# Altium footprint library Molex FFC - FPC Connectors (SMT).PcbLib: 638 footprints (part 16 of 40)
Each footprint in its own frame and in the unit in brackets; x right, y up, seen from the top. Pads: shape width x height; smd on the part's side, far side on the other; paste and mask are expansions set on the pad; w line width, h text height; cw(c..) or ccw(c..) is an arc to the next point about the centre after c.
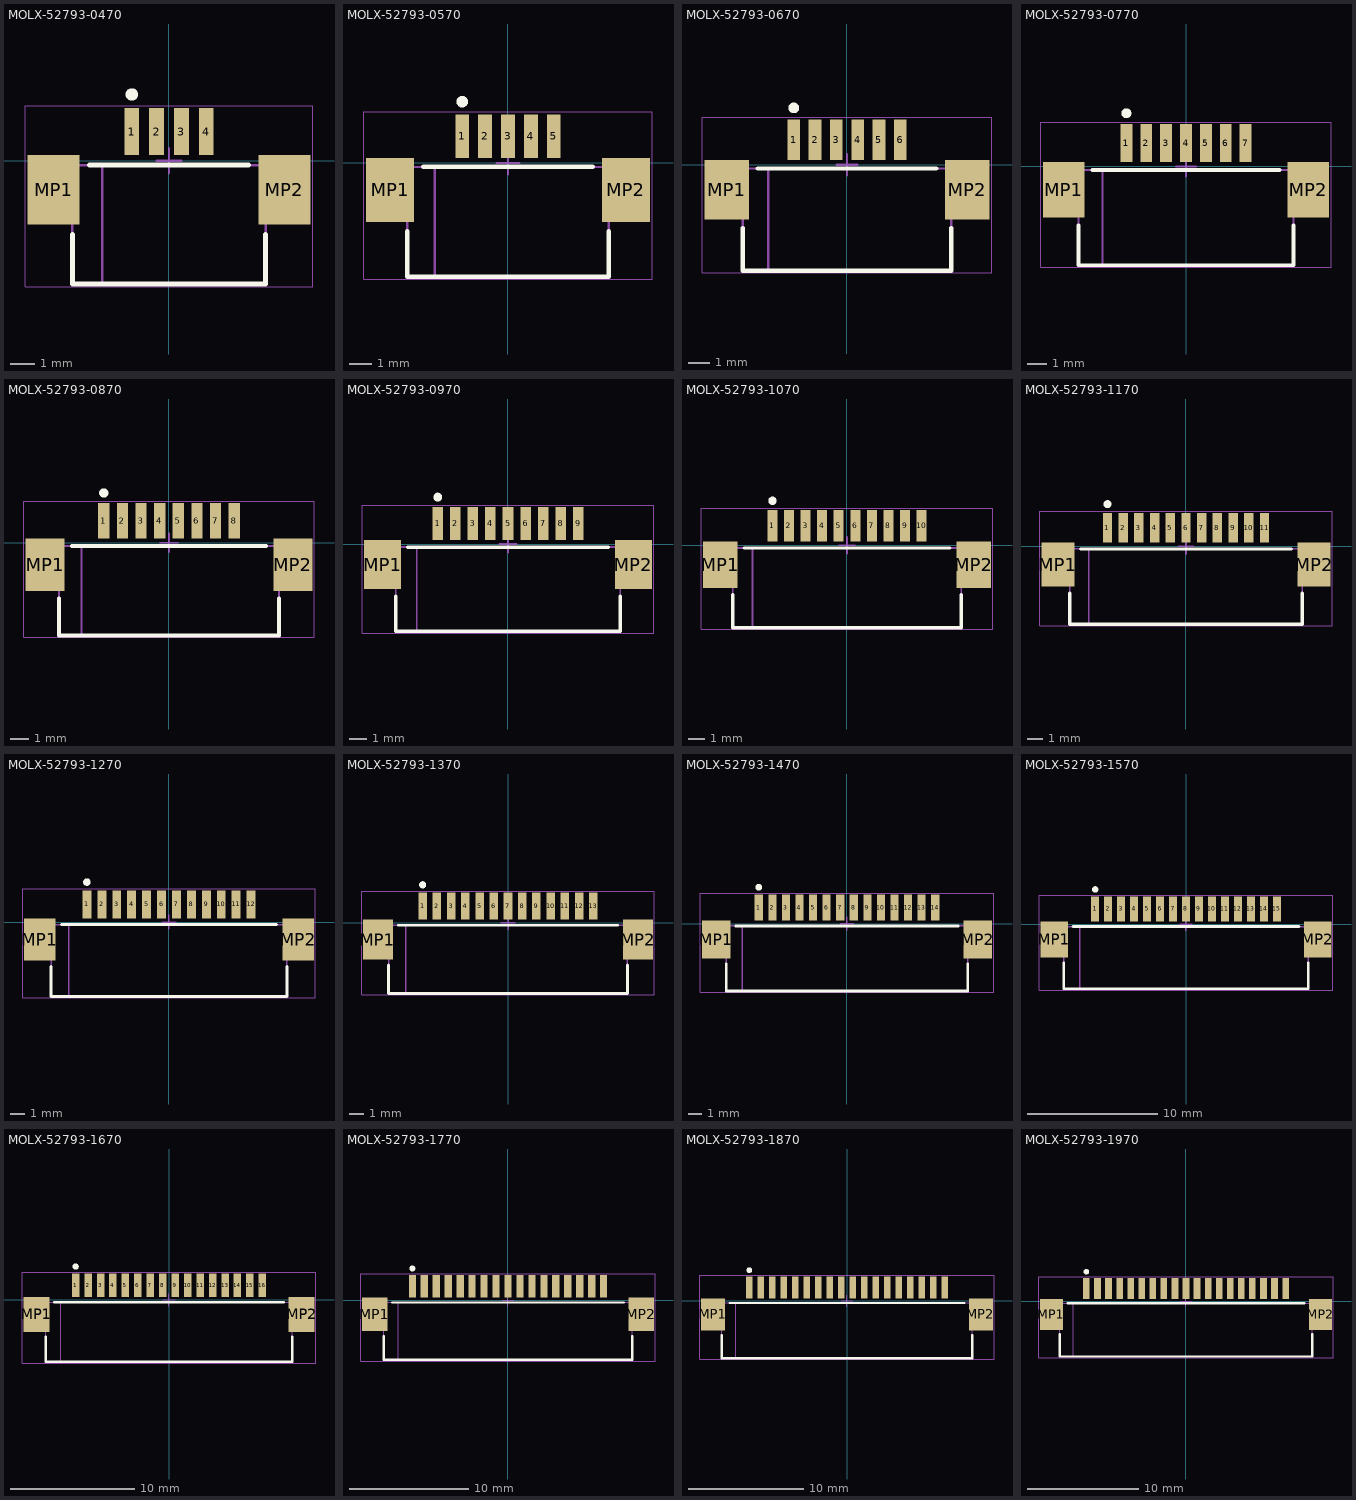
[diagram p15: the footprints below, top view; thin cyan lines are the x and y axes]

## MOLX-52793-0470 [mm] "FFC Connector, 4-Leads, Right Angle, Pitch 1.0 mm, Mated Height 3.1 mm, SMT"
height 3.1
pads (6):
  rect 0.6x1.9 smd: 1(-1.5,1.175) 2(-0.5,1.175) 3(0.5,1.175) 4(1.5,1.175)
  rect 2.1x2.8 smd: MP1(-4.65,-1.175) MP2(4.65,-1.175)
Top Overlay:
  circle w0.25: c-1.5,2.675 r0.125
  lines w0.2: -3.9,-2.975 -3.9,-4.975 3.9,-4.975 3.9,-2.975 ; -3.2,-0.175 3.2,-0.175
Mechanical 13:
  lines w0.1: -2.7,-4.975 -2.7,-0.175 ; -3.9,-4.975 3.9,-4.975 3.9,-0.175 -3.9,-0.175 -3.9,-4.975
Mechanical 15:
  lines w0.05: -5.8,-5.075 -5.8,2.225 5.8,2.225 5.8,-5.075 -5.8,-5.075
  lines w0.1: -0.5,0 0.5,0 ; 0,-0.5 0,0.5
3D body: height 0.25, standoff 0, extent -5.15,-4.975 5.15,1.825

## MOLX-52793-0570 [mm] "FFC Connector, 5-Leads, Right Angle, Pitch 1.0 mm, Mated Height 3.1 mm, SMT"
height 3.1
pads (7):
  rect 0.6x1.9 smd: 1(-2,1.175) 2(-1,1.175) 3(0,1.175) 4(1,1.175) 5(2,1.175)
  rect 2.1x2.8 smd: MP1(-5.15,-1.175) MP2(5.15,-1.175)
Top Overlay:
  circle w0.25: c-2,2.675 r0.125
  lines w0.2: -4.4,-2.975 -4.4,-4.975 4.4,-4.975 4.4,-2.975 ; -3.7,-0.175 3.7,-0.175
Mechanical 13:
  lines w0.1: -3.2,-4.975 -3.2,-0.175 ; -4.4,-4.975 -4.4,-0.175 4.4,-0.175 4.4,-4.975 -4.4,-4.975
Mechanical 15:
  lines w0.05: -6.3,-5.075 6.3,-5.075 6.3,2.225 -6.3,2.225 -6.3,-5.075
  lines w0.1: -0.5,0 0.5,0 ; 0,-0.5 0,0.5
3D body: height 0.25, standoff 0, extent -5.65,-4.975 5.65,1.825

## MOLX-52793-0670 [mm] "FFC Connector, 6-Leads, Right Angle, Pitch 1.0 mm, Mated Height 3.1 mm, SMT"
height 3.1
pads (8):
  rect 0.6x1.9 smd: 1(-2.5,1.175) 2(-1.5,1.175) 3(-0.5,1.175) 4(0.5,1.175) 5(1.5,1.175) 6(2.5,1.175)
  rect 2.1x2.8 smd: MP1(-5.65,-1.175) MP2(5.65,-1.175)
Top Overlay:
  circle w0.25: c-2.5,2.675 r0.125
  lines w0.2: -4.9,-2.975 -4.9,-4.975 4.9,-4.975 4.9,-2.975 ; -4.2,-0.175 4.2,-0.175
Mechanical 13:
  lines w0.1: -3.7,-4.975 -3.7,-0.175 ; -4.9,-4.975 4.9,-4.975 4.9,-0.175 -4.9,-0.175 -4.9,-4.975
Mechanical 15:
  lines w0.05: -6.8,-5.075 -6.8,2.225 6.8,2.225 6.8,-5.075 -6.8,-5.075
  lines w0.1: -0.5,0 0.5,0 ; 0,-0.5 0,0.5
3D body: height 0.25, standoff 0, extent -6.15,-4.975 6.15,1.825

## MOLX-52793-0770 [mm] "FFC Connector, 7-Leads, Right Angle, Pitch 1.0 mm, Mated Height 3.1 mm, SMT"
height 3.1
pads (9):
  rect 0.6x1.9 smd: 1(-3,1.175) 2(-2,1.175) 3(-1,1.175) 4(0,1.175) 5(1,1.175) 6(2,1.175) 7(3,1.175)
  rect 2.1x2.8 smd: MP1(-6.15,-1.175) MP2(6.15,-1.175)
Top Overlay:
  circle w0.25: c-3,2.675 r0.125
  lines w0.2: -5.4,-2.975 -5.4,-4.975 5.4,-4.975 5.4,-2.975 ; -4.7,-0.175 4.7,-0.175
Mechanical 13:
  lines w0.1: -4.2,-4.975 -4.2,-0.175 ; -5.4,-4.975 5.4,-4.975 5.4,-0.175 -5.4,-0.175 -5.4,-4.975
Mechanical 15:
  lines w0.05: -7.3,-5.075 7.3,-5.075 7.3,2.225 -7.3,2.225 -7.3,-5.075
  lines w0.1: -0.5,0 0.5,0 ; 0,-0.5 0,0.5
3D body: height 0.25, standoff 0, extent -6.65,-4.975 6.65,1.825

## MOLX-52793-0870 [mm] "FFC Connector, 8-Leads, Right Angle, Pitch 1.0 mm, Mated Height 3.1 mm, SMT"
height 3.1
pads (10):
  rect 0.6x1.9 smd: 1(-3.5,1.175) 2(-2.5,1.175) 3(-1.5,1.175) 4(-0.5,1.175) 5(0.5,1.175) 6(1.5,1.175) 7(2.5,1.175) 8(3.5,1.175)
  rect 2.1x2.8 smd: MP1(-6.65,-1.175) MP2(6.65,-1.175)
Top Overlay:
  circle w0.25: c-3.5,2.675 r0.125
  lines w0.2: -5.9,-2.975 -5.9,-4.975 5.9,-4.975 5.9,-2.975 ; -5.2,-0.175 5.2,-0.175
Mechanical 13:
  lines w0.1: -4.7,-4.975 -4.7,-0.175 ; -5.9,-4.975 -5.9,-0.175 5.9,-0.175 5.9,-4.975 -5.9,-4.975
Mechanical 15:
  lines w0.05: -7.8,-5.075 -7.8,2.225 7.8,2.225 7.8,-5.075 -7.8,-5.075
  lines w0.1: -0.5,0 0.5,0 ; 0,-0.5 0,0.5
3D body: height 0.25, standoff 0, extent -7.15,-4.975 7.15,1.825

## MOLX-52793-0970 [mm] "FFC Connector, 9-Leads, Right Angle, Pitch 1.0 mm, Mated Height 3.1 mm, SMT"
height 3.1
pads (11):
  rect 0.6x1.9 smd: 1(-4,1.175) 2(-3,1.175) 3(-2,1.175) 4(-1,1.175) 5(0,1.175) 6(1,1.175) 7(2,1.175) 8(3,1.175) 9(4,1.175)
  rect 2.1x2.8 smd: MP1(-7.15,-1.175) MP2(7.15,-1.175)
Top Overlay:
  circle w0.25: c-4,2.675 r0.125
  lines w0.2: -6.4,-2.975 -6.4,-4.975 6.4,-4.975 6.4,-2.975 ; -5.7,-0.175 5.7,-0.175
Mechanical 13:
  lines w0.1: -5.2,-4.975 -5.2,-0.175 ; -6.4,-4.975 6.4,-4.975 6.4,-0.175 -6.4,-0.175 -6.4,-4.975
Mechanical 15:
  lines w0.05: -8.3,-5.075 8.3,-5.075 8.3,2.225 -8.3,2.225 -8.3,-5.075
  lines w0.1: -0.5,0 0.5,0 ; 0,-0.5 0,0.5
3D body: height 0.25, standoff 0, extent -7.65,-4.975 7.65,1.825

## MOLX-52793-1070 [mm] "FFC Connector, 10-Leads, Right Angle, Pitch 1.0 mm, Mated Height 3.1 mm, SMT"
height 3.1
pads (12):
  rect 0.6x1.9 smd: 1(-4.5,1.175) 2(-3.5,1.175) 3(-2.5,1.175) 4(-1.5,1.175) 5(-0.5,1.175) 6(0.5,1.175) 7(1.5,1.175) 8(2.5,1.175) 9(3.5,1.175) 10(4.5,1.175)
  rect 2.1x2.8 smd: MP1(-7.65,-1.175) MP2(7.65,-1.175)
Top Overlay:
  circle w0.25: c-4.5,2.675 r0.125
  lines w0.2: -6.9,-2.975 -6.9,-4.975 6.9,-4.975 6.9,-2.975 ; -6.2,-0.175 6.2,-0.175
Mechanical 13:
  lines w0.1: -5.7,-4.975 -5.7,-0.175 ; -6.9,-4.975 -6.9,-0.175 6.9,-0.175 6.9,-4.975 -6.9,-4.975
Mechanical 15:
  lines w0.05: -8.8,-5.075 -8.8,2.225 8.8,2.225 8.8,-5.075 -8.8,-5.075
  lines w0.1: -0.5,0 0.5,0 ; 0,-0.5 0,0.5
3D body: height 0.25, standoff 0, extent -8.15,-4.975 8.15,1.825

## MOLX-52793-1170 [mm] "FFC Connector, 11-Leads, Right Angle, Pitch 1.0 mm, Mated Height 3.1 mm, SMT"
height 3.1
pads (13):
  rect 0.6x1.9 smd: 1(-5,1.175) 2(-4,1.175) 3(-3,1.175) 4(-2,1.175) 5(-1,1.175) 6(0,1.175) 7(1,1.175) 8(2,1.175) 9(3,1.175) 10(4,1.175) 11(5,1.175)
  rect 2.1x2.8 smd: MP1(-8.15,-1.175) MP2(8.15,-1.175)
Top Overlay:
  circle w0.25: c-5,2.675 r0.125
  lines w0.2: -7.4,-2.975 -7.4,-4.975 7.4,-4.975 7.4,-2.975 ; -6.7,-0.175 6.7,-0.175
Mechanical 13:
  lines w0.1: -6.2,-4.975 -6.2,-0.175 ; -7.4,-4.975 -7.4,-0.175 7.4,-0.175 7.4,-4.975 -7.4,-4.975
Mechanical 15:
  lines w0.05: -9.3,-5.075 -9.3,2.225 9.3,2.225 9.3,-5.075 -9.3,-5.075
  lines w0.1: -0.5,0 0.5,0 ; 0,-0.5 0,0.5
3D body: height 0.25, standoff 0, extent -8.65,-4.975 8.65,1.825

## MOLX-52793-1270 [mm] "FFC Connector, 12-Leads, Right Angle, Pitch 1.0 mm, Mated Height 3.1 mm, SMT"
height 3.1
pads (14):
  rect 0.6x1.9 smd: 1(-5.5,1.175) 2(-4.5,1.175) 3(-3.5,1.175) 4(-2.5,1.175) 5(-1.5,1.175) 6(-0.5,1.175) 7(0.5,1.175) 8(1.5,1.175) 9(2.5,1.175) 10(3.5,1.175) 11(4.5,1.175) 12(5.5,1.175)
  rect 2.1x2.8 smd: MP1(-8.65,-1.175) MP2(8.65,-1.175)
Top Overlay:
  circle w0.25: c-5.5,2.675 r0.125
  lines w0.2: -7.9,-2.975 -7.9,-4.975 7.9,-4.975 7.9,-2.975 ; -7.2,-0.175 7.2,-0.175
Mechanical 13:
  lines w0.1: -6.7,-4.975 -6.7,-0.175 ; -7.9,-4.975 -7.9,-0.175 7.9,-0.175 7.9,-4.975 -7.9,-4.975
Mechanical 15:
  lines w0.05: -9.8,-5.075 -9.8,2.225 9.8,2.225 9.8,-5.075 -9.8,-5.075
  lines w0.1: -0.5,0 0.5,0 ; 0,-0.5 0,0.5
3D body: height 0.25, standoff 0, extent -9.15,-4.975 9.15,1.825

## MOLX-52793-1370 [mm] "FFC Connector, 13-Leads, Right Angle, Pitch 1.0 mm, Mated Height 3.1 mm, SMT"
height 3.1
pads (15):
  rect 0.6x1.9 smd: 1(-6,1.175) 2(-5,1.175) 3(-4,1.175) 4(-3,1.175) 5(-2,1.175) 6(-1,1.175) 7(0,1.175) 8(1,1.175) 9(2,1.175) 10(3,1.175) 11(4,1.175) 12(5,1.175) 13(6,1.175)
  rect 2.1x2.8 smd: MP1(-9.15,-1.175) MP2(9.15,-1.175)
Top Overlay:
  circle w0.25: c-6,2.675 r0.125
  lines w0.2: -8.4,-2.975 -8.4,-4.975 8.4,-4.975 8.4,-2.975 ; -7.7,-0.175 7.7,-0.175
Mechanical 13:
  lines w0.1: -7.2,-4.975 -7.2,-0.175 ; -8.4,-4.975 8.4,-4.975 8.4,-0.175 -8.4,-0.175 -8.4,-4.975
Mechanical 15:
  lines w0.05: -10.3,-5.075 10.3,-5.075 10.3,2.225 -10.3,2.225 -10.3,-5.075
  lines w0.1: -0.5,0 0.5,0 ; 0,-0.5 0,0.5
3D body: height 0.25, standoff 0, extent -9.65,-4.975 9.65,1.825

## MOLX-52793-1470 [mm] "FFC Connector, 14-Leads, Right Angle, Pitch 1.0 mm, Mated Height 3.1 mm, SMT"
height 3.1
pads (16):
  rect 0.6x1.9 smd: 1(-6.5,1.175) 2(-5.5,1.175) 3(-4.5,1.175) 4(-3.5,1.175) 5(-2.5,1.175) 6(-1.5,1.175) 7(-0.5,1.175) 8(0.5,1.175) 9(1.5,1.175) 10(2.5,1.175) 11(3.5,1.175) 12(4.5,1.175) 13(5.5,1.175) 14(6.5,1.175)
  rect 2.1x2.8 smd: MP1(-9.65,-1.175) MP2(9.65,-1.175)
Top Overlay:
  circle w0.25: c-6.5,2.675 r0.125
  lines w0.2: -8.9,-2.975 -8.9,-4.975 8.9,-4.975 8.9,-2.975 ; -8.2,-0.175 8.2,-0.175
Mechanical 13:
  lines w0.1: -7.7,-4.975 -7.7,-0.175 ; -8.9,-4.975 -8.9,-0.175 8.9,-0.175 8.9,-4.975 -8.9,-4.975
Mechanical 15:
  lines w0.05: -10.8,-5.075 -10.8,2.225 10.8,2.225 10.8,-5.075 -10.8,-5.075
  lines w0.1: -0.5,0 0.5,0 ; 0,-0.5 0,0.5
3D body: height 0.25, standoff 0, extent -10.15,-4.975 10.15,1.825

## MOLX-52793-1570 [mm] "FFC Connector, 15-Leads, Right Angle, Pitch 1.0 mm, Mated Height 3.1 mm, SMT"
height 3.1
pads (17):
  rect 0.6x1.9 smd: 1(-7,1.175) 2(-6,1.175) 3(-5,1.175) 4(-4,1.175) 5(-3,1.175) 6(-2,1.175) 7(-1,1.175) 8(0,1.175) 9(1,1.175) 10(2,1.175) 11(3,1.175) 12(4,1.175) 13(5,1.175) 14(6,1.175) 15(7,1.175)
  rect 2.1x2.8 smd: MP1(-10.15,-1.175) MP2(10.15,-1.175)
Top Overlay:
  circle w0.25: c-7,2.675 r0.125
  lines w0.2: -9.4,-2.975 -9.4,-4.975 9.4,-4.975 9.4,-2.975 ; -8.7,-0.175 8.7,-0.175
Mechanical 13:
  lines w0.1: -8.2,-4.975 -8.2,-0.175 ; -9.4,-4.975 9.4,-4.975 9.4,-0.175 -9.4,-0.175 -9.4,-4.975
Mechanical 15:
  lines w0.05: -11.3,-5.075 11.3,-5.075 11.3,2.225 -11.3,2.225 -11.3,-5.075
  lines w0.1: -0.5,0 0.5,0 ; 0,-0.5 0,0.5
3D body: height 0.25, standoff 0, extent -10.65,-4.975 10.65,1.825

## MOLX-52793-1670 [mm] "FFC Connector, 16-Leads, Right Angle, Pitch 1.0 mm, Mated Height 3.1 mm, SMT"
height 3.1
pads (18):
  rect 0.6x1.9 smd: 1(-7.5,1.175) 2(-6.5,1.175) 3(-5.5,1.175) 4(-4.5,1.175) 5(-3.5,1.175) 6(-2.5,1.175) 7(-1.5,1.175) 8(-0.5,1.175) 9(0.5,1.175) 10(1.5,1.175) 11(2.5,1.175) 12(3.5,1.175) 13(4.5,1.175) 14(5.5,1.175) 15(6.5,1.175) 16(7.5,1.175)
  rect 2.1x2.8 smd: MP1(-10.65,-1.175) MP2(10.65,-1.175)
Top Overlay:
  circle w0.25: c-7.5,2.675 r0.125
  lines w0.2: -9.9,-2.975 -9.9,-4.975 9.9,-4.975 9.9,-2.975 ; -9.2,-0.175 9.2,-0.175
Mechanical 13:
  lines w0.1: -8.7,-4.975 -8.7,-0.175 ; -9.9,-4.975 9.9,-4.975 9.9,-0.175 -9.9,-0.175 -9.9,-4.975
Mechanical 15:
  lines w0.05: -11.8,-5.075 11.8,-5.075 11.8,2.225 -11.8,2.225 -11.8,-5.075
  lines w0.1: -0.5,0 0.5,0 ; 0,-0.5 0,0.5
3D body: height 0.25, standoff 0, extent -11.15,-4.975 11.15,1.825

## MOLX-52793-1770 [mm] "FFC Connector, 17-Leads, Right Angle, Pitch 1.0 mm, Mated Height 3.1 mm, SMT"
height 3.1
pads (19):
  rect 0.6x1.9 smd: 1(-8,1.175) 2(-7,1.175) 3(-6,1.175) 4(-5,1.175) 5(-4,1.175) 6(-3,1.175) 7(-2,1.175) 8(-1,1.175) 9(0,1.175) 10(1,1.175) 11(2,1.175) 12(3,1.175) 13(4,1.175) 14(5,1.175) 15(6,1.175) 16(7,1.175) 17(8,1.175)
  rect 2.1x2.8 smd: MP1(-11.15,-1.175) MP2(11.15,-1.175)
Top Overlay:
  circle w0.25: c-8,2.675 r0.125
  lines w0.2: -10.4,-2.975 -10.4,-4.975 10.4,-4.975 10.4,-2.975 ; -9.7,-0.175 9.7,-0.175
Mechanical 13:
  lines w0.1: -9.2,-4.975 -9.2,-0.175 ; -10.4,-4.975 10.4,-4.975 10.4,-0.175 -10.4,-0.175 -10.4,-4.975
Mechanical 15:
  lines w0.05: -12.3,-5.075 12.3,-5.075 12.3,2.225 -12.3,2.225 -12.3,-5.075
  lines w0.1: -0.5,0 0.5,0 ; 0,-0.5 0,0.5
3D body: height 0.25, standoff 0, extent -11.65,-4.975 11.65,1.825

## MOLX-52793-1870 [mm] "FFC Connector, 18-Leads, Right Angle, Pitch 1.0 mm, Mated Height 3.1 mm, SMT"
height 3.1
pads (20):
  rect 0.6x1.9 smd: 1(-8.5,1.175) 2(-7.5,1.175) 3(-6.5,1.175) 4(-5.5,1.175) 5(-4.5,1.175) 6(-3.5,1.175) 7(-2.5,1.175) 8(-1.5,1.175) 9(-0.5,1.175) 10(0.5,1.175) 11(1.5,1.175) 12(2.5,1.175) 13(3.5,1.175) 14(4.5,1.175) 15(5.5,1.175) 16(6.5,1.175) 17(7.5,1.175) 18(8.5,1.175)
  rect 2.1x2.8 smd: MP1(-11.65,-1.175) MP2(11.65,-1.175)
Top Overlay:
  circle w0.25: c-8.5,2.675 r0.125
  lines w0.2: -10.9,-2.975 -10.9,-4.975 10.9,-4.975 10.9,-2.975 ; -10.2,-0.175 10.2,-0.175
Mechanical 13:
  lines w0.1: -9.7,-4.975 -9.7,-0.175 ; -10.9,-4.975 -10.9,-0.175 10.9,-0.175 10.9,-4.975 -10.9,-4.975
Mechanical 15:
  lines w0.05: -12.8,-5.075 -12.8,2.225 12.8,2.225 12.8,-5.075 -12.8,-5.075
  lines w0.1: -0.5,0 0.5,0 ; 0,-0.5 0,0.5
3D body: height 0.25, standoff 0, extent -12.15,-4.975 12.15,1.825

## MOLX-52793-1970 [mm] "FFC Connector, 19-Leads, Right Angle, Pitch 1.0 mm, Mated Height 3.1 mm, SMT"
height 3.1
pads (21):
  rect 0.6x1.9 smd: 1(-9,1.175) 2(-8,1.175) 3(-7,1.175) 4(-6,1.175) 5(-5,1.175) 6(-4,1.175) 7(-3,1.175) 8(-2,1.175) 9(-1,1.175) 10(0,1.175) 11(1,1.175) 12(2,1.175) 13(3,1.175) 14(4,1.175) 15(5,1.175) 16(6,1.175) 17(7,1.175) 18(8,1.175) 19(9,1.175)
  rect 2.1x2.8 smd: MP1(-12.15,-1.175) MP2(12.15,-1.175)
Top Overlay:
  circle w0.25: c-9,2.675 r0.125
  lines w0.2: -11.4,-2.975 -11.4,-4.975 11.4,-4.975 11.4,-2.975 ; -10.7,-0.175 10.7,-0.175
Mechanical 13:
  lines w0.1: -10.2,-4.975 -10.2,-0.175 ; -11.4,-4.975 -11.4,-0.175 11.4,-0.175 11.4,-4.975 -11.4,-4.975
Mechanical 15:
  lines w0.05: -13.3,-5.075 -13.3,2.225 13.3,2.225 13.3,-5.075 -13.3,-5.075
  lines w0.1: -0.5,0 0.5,0 ; 0,-0.5 0,0.5
3D body: height 0.25, standoff 0, extent -12.65,-4.975 12.65,1.825